# Altium footprint library rcl.PCBLIB: 513 footprints (part 30 of 33)
Each footprint in its own frame and in the unit in brackets; x right, y up, seen from the top. Pads: shape width x height; smd on the part's side, far side on the other; paste and mask are expansions set on the pad; w line width, h text height; cw(c..) or ccw(c..) is an arc to the next point about the centre after c.
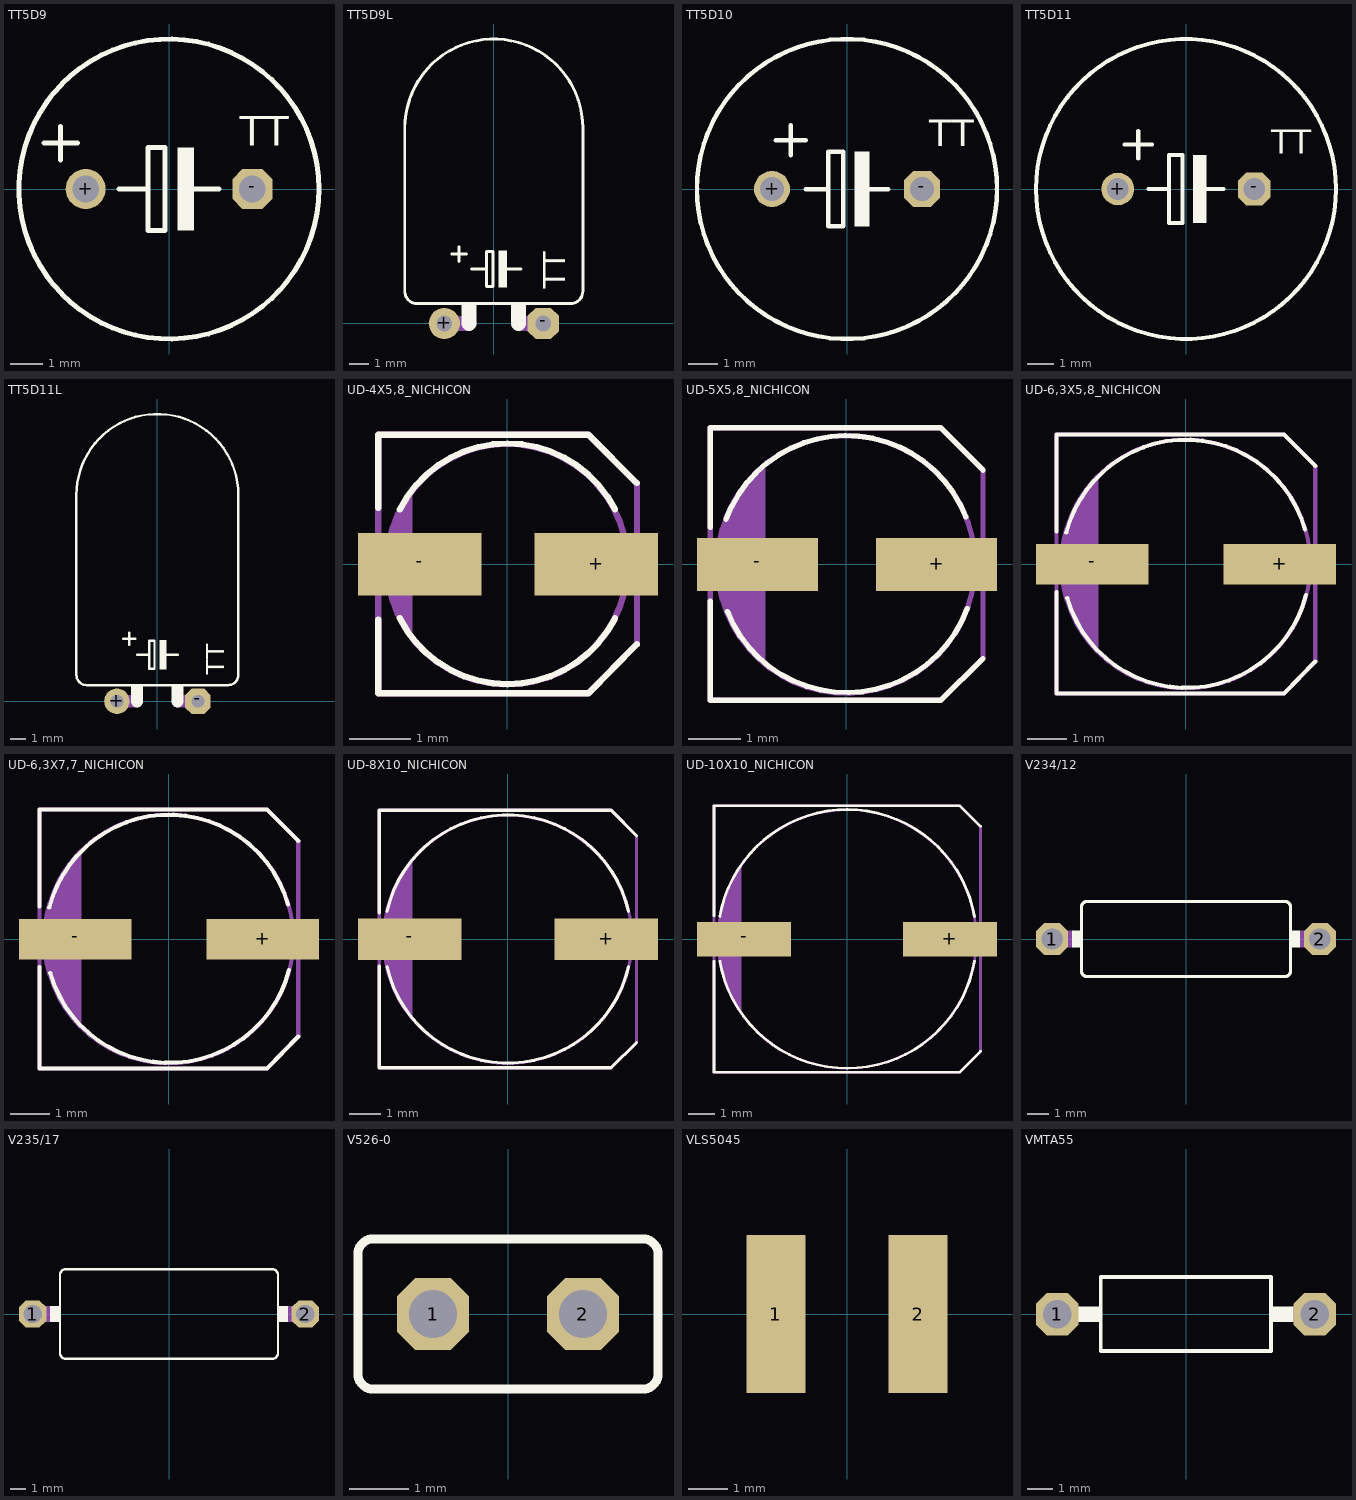
[diagram p29: the footprints below, top view; thin cyan lines are the x and y axes]

## TT5D9 [mil]
pads (2):
  round 48 hole 32: +(-100,0)
  oct 48x48 hole 32: -(100,0)
Top Overlay:
  circle w6: c0,0 r180
  rectangle: 10,-50 30,50
  lines w6: -150,55 -110,55 ; -130,35 -130,75 ; -60,0 -25,0 ; 25,0 60,0 ; -25,0 -25,-50 -5,-50 -5,50 -25,50 -25,0
  text "TT" at 85,40 h60.45

## TT5D9L [mil]
pads (2):
  round 63 hole 32: +(-100,0)
  oct 63x63 hole 32: -(100,0)
Top Overlay:
  rectangle: 10,73 27,147
  rectangle: 35,25 65,40
  rectangle: -65,25 -35,40
  lines w6: -85,140 -55,140 ; -70,125 -70,155 ; -45,110 -15,110 ; 25,110 55,110 ; -15,110 -15,145 -2,145 -2,75 -15,75 -15,110 ; -180,65 ccw(c-155,65) -155,40 155,40 ccw(c155,65) 180,65 180,395 ccw(c0,395) -180,395 -180,65
  lines w30: -50,0 -50,25 ; 50,0 50,25
  text "TT" at 160,70 h77.5
Mechanical 4:
  rectangle: -100,-15 -65,15
  rectangle: 65,-15 100,15
  lines w30: -60,0 -50,0 ; 50,0 60,0

## TT5D10 [mil]
pads (2):
  round 48 hole 32: +(-100,0)
  oct 48x48 hole 32: -(100,0)
Top Overlay:
  circle w6: c0,0 r200
  rectangle: 10,-50 30,50
  lines w6: -95,65 -55,65 ; -75,45 -75,85 ; -55,0 -25,0 ; 25,0 55,0 ; -25,0 -25,50 -5,50 -5,-50 -25,-50 -25,0
  text "TT" at 110,45 h60.45

## TT5D11 [mil]
pads (2):
  round 48 hole 32: +(-100,0)
  oct 48x48 hole 32: -(100,0)
Top Overlay:
  circle w6: c0,0 r220
  rectangle: 10,-50 30,50
  lines w6: -90,65 -50,65 ; -70,45 -70,85 ; -55,0 -25,0 ; 25,0 55,0 ; -25,0 -25,-50 -5,-50 -5,50 -25,50 -25,0
  text "TT" at 125,40 h60.45

## TT5D11L [mil]
pads (2):
  round 63 hole 32: +(-100,0)
  oct 63x63 hole 32: -(100,0)
Top Overlay:
  rectangle: 5,78 22,152
  rectangle: 35,25 65,40
  rectangle: -65,25 -35,40
  lines w6: -85,155 -55,155 ; -70,140 -70,170 ; -50,115 -20,115 ; 20,115 50,115 ; -20,115 -20,150 -7,150 -7,80 -20,80 -20,115 ; -200,65 ccw(c-175,65) -175,40 175,40 ccw(c175,65) 200,65 200,510 ccw(c0,510) -200,510 -200,65
  lines w30: -50,0 -50,25 ; 50,0 50,25
  text "TT" at 180,65 h77.5
Mechanical 4:
  rectangle: -100,-15 -65,15
  rectangle: 65,-15 100,15
  lines w30: -60,0 -50,0 ; 50,0 60,0

## UD-4X5,8_NICHICON [mil]
pads (2):
  rect 79x40 smd: +(57,0) -(-56.1,0)
Top Overlay:
  lines w4: -82.68,-35.43 -82.68,-82.68 52,-82.68 83,-51.18 ; -82.68,36 -82.68,83 52,83 83,52 ; -68.9,-34.45 ccw(c0.05,0.48) 69,-34.45 ; -68.9,35 cw(c0.05,0.07) 69,35
Mechanical 4:
  circle w4: c0,0 r77
  region: -61.02,47 -64.71,41.96 -70.4,30.83 -74.28,18.96 -76.24,6.62 -76.24,-5.88 -74.28,-18.22 -70.4,-30.09 -64.71,-41.22 -61.02,-46.26
  lines w4: -82.68,-82.68 52,-82.68 83,-51.18 83,52 52,83 -82.68,83 -82.68,-82.68

## UD-5X5,8_NICHICON [mil]
pads (2):
  rect 91x40 smd: +(68,0) -(-66.93,0)
Top Overlay:
  lines w4: -102.36,-27.56 -102.36,-102.36 71,-102.36 103,-70.87 ; -102.36,28 -102.36,103 71,103 103,71 ; -90.55,34 cw(c0.11,0.33) 90,36 ; -89.57,-35.43 ccw(c0.34,0.22) 91,-33.46
Mechanical 4:
  circle w4: c0,0 r97
  region: -61.02,74 -66.41,69.49 -75.77,58.99 -83.51,47.25 -89.46,34.51 -93.5,21.04 -95.54,7.12 -95.54,-6.94 -93.5,-20.85 -89.46,-34.32 -83.51,-47.07 -75.77,-58.81 -66.41,-69.31 -61.02,-73.82
  lines w4: -102.36,-102.36 -102.36,103 71,103 103,71 103,-70.87 71,-102.36 -102.36,-102.36

## UD-6,3X5,8_NICHICON [mil]
pads (2):
  rect 111x40 smd: +(93,0) -(-92.52,0)
Top Overlay:
  lines w4: -127.95,-27.56 -127.95,-127.95 97,-127.95 128,-96.46 ; -127.95,32 -127.95,128 97,128 128,97 ; -118.11,31 cw(c0.35,0.59) 118,34 ; -117.13,-33.46 ccw(c0.54,-0.08) 119,-30.51
Mechanical 4:
  circle w4: c0,0 r123
  region: -86.61,85 -92.09,79.39 -101.5,66.86 -109.22,53.23 -115.13,38.71 -119.13,23.56 -121.14,8.01 -121.14,-7.66 -119.13,-23.2 -115.13,-38.36 -109.22,-52.87 -101.5,-66.51 -92.09,-79.04 -86.61,-84.65
  lines w4: -127.95,-127.95 97,-127.95 128,-96.46 128,97 97,128 -127.95,128 -127.95,-127.95

## UD-6,3X7,7_NICHICON [mil]
pads (2):
  rect 111x40 smd: +(93,0) -(-92.52,0)
Top Overlay:
  lines w4: -127.95,-27.56 -127.95,-127.95 97,-127.95 128,-96.46 ; -127.95,32 -127.95,128 97,128 128,97 ; -118.11,31 cw(c0.35,0.59) 118,34 ; -117.13,-33.46 ccw(c0.54,-0.08) 119,-30.51
Mechanical 4:
  circle w4: c0,0 r123
  region: -86.61,85 -92.09,79.39 -101.5,66.86 -109.22,53.23 -115.13,38.71 -119.13,23.56 -121.14,8.01 -121.14,-7.66 -119.13,-23.2 -115.13,-38.36 -109.22,-52.87 -101.5,-66.51 -92.09,-79.04 -86.61,-84.65
  lines w4: -127.95,-127.95 97,-127.95 128,-96.46 128,97 97,128 -127.95,128 -127.95,-127.95

## UD-8X10_NICHICON [mil]
pads (2):
  rect 130x52 smd: +(124,0) -(-123.03,0)
Top Overlay:
  lines w4: -161.42,-33.46 -161.42,-161.42 130,-161.42 162,-129.92 ; -161.42,33 -161.42,162 130,162 162,130 ; -151.57,-34.45 ccw(c0.21,-0.05) 152,-34.45 ; -151.57,35 cw(c0.21,0.6) 152,35
Mechanical 4:
  circle w4: c0,0 r156
  region: -120.08,98 -125.62,91.14 -135.08,76.27 -142.8,60.42 -148.68,43.79 -152.64,26.61 -154.64,9.1 -154.64,-8.54 -152.64,-26.05 -148.68,-43.23 -142.8,-59.86 -135.08,-75.71 -125.62,-90.58 -120.08,-97.44
  lines w4: -161.42,-161.42 130,-161.42 162,-129.92 162,130 130,162 -161.42,162 -161.42,-161.42

## UD-10X10_NICHICON [mil]
pads (2):
  rect 142x52 smd: +(155,0) -(-155.51,0)
Top Overlay:
  lines w4: -200.79,-33.46 -200.79,-200.79 170,-200.79 201,-169.29 ; -200.79,35 -200.79,201 170,201 201,170 ; -191.93,-33.46 ccw(c0.04,-0.06) 192,-33.46 ; -191.93,34 cw(c0.04,0.6) 192,34
Mechanical 4:
  circle w4: c0,0 r195
  region: -159.45,111 -165.07,102.9 -174.61,85.64 -182.37,67.51 -188.25,48.69 -192.21,29.37 -194.2,9.75 -194.2,-9.97 -192.21,-29.59 -188.25,-48.91 -182.37,-67.73 -174.61,-85.86 -165.07,-103.12 -159.45,-111.22
  lines w4: -200.79,-200.79 170,-200.79 201,-169.29 201,170 170,201 -200.79,201 -200.79,-200.79

## V234/12 [mil]
pads (2):
  oct 60x60 hole 40: 1(-250,0) 2(250,0)
Top Overlay:
  rectangle: 195,-16 213,16
  rectangle: -213,-16 -195,16
  lines w6: -195,-60 ccw(c-185,-60) -185,-70 185,-70 ccw(c185,-60) 195,-60 195,60 ccw(c185,60) 185,70 -185,70 ccw(c-185,60) -195,60 -195,-60
Mechanical 4:
  lines w32: -250,0 -215,0 ; 215,0 250,0

## V235/17 [mil]
pads (2):
  oct 70.5x70.5 hole 47: 1(-350,0) 2(350,0)
Top Overlay:
  rectangle: 280,-20 305,20
  rectangle: -305,-20 -280,20
  lines w6: -280,-100 ccw(c-265,-100) -265,-115 265,-115 ccw(c265,-100) 280,-100 280,100 ccw(c265,100) 265,115 -265,115 ccw(c-265,100) -280,100 -280,-100
Mechanical 4:
  lines w40: -350,0 -310,0 ; 310,0 350,0

## V526-0 [mil]
pads (2):
  oct 48x48 hole 32: 1(-50,0) 2(50,0)
Top Overlay:
  lines w6: -100,-40 ccw(c-90,-40) -90,-50 90,-50 ccw(c90,-40) 100,-40 100,40 ccw(c90,40) 90,50 -90,50 ccw(c-90,40) -100,40 -100,-40

## VLS5045 [mm] "Inductors for power circuits"
height 1.8
pads (2):
  rect 1.5x4 smd: 1(-1.8,0) 2(1.8,0)
3D body "srn4012t-4r7m.stp": height 1.2, standoff -0.01, extent -2.01,-2.01 2.01,2.01

## VMTA55 [mil]
pads (2):
  oct 66x66 hole 44: 1(-200,0) 2(200,0)
Top Overlay:
  rectangle: 130,-12 167,12
  rectangle: -167.72,-12 -130.22,12
  lines w6: -132.38,-57.09 132,-57.09 132,58 -132.38,58 -132.38,-57.09
Mechanical 4:
  lines w24: -200,0 -167.72,0 ; 167,0 200,0